# Altium integrated library ANLOGIC开发板封装库.IntLib: 55 symbols
Pins are listed as number, name and electrical type; pins without a type are passive.

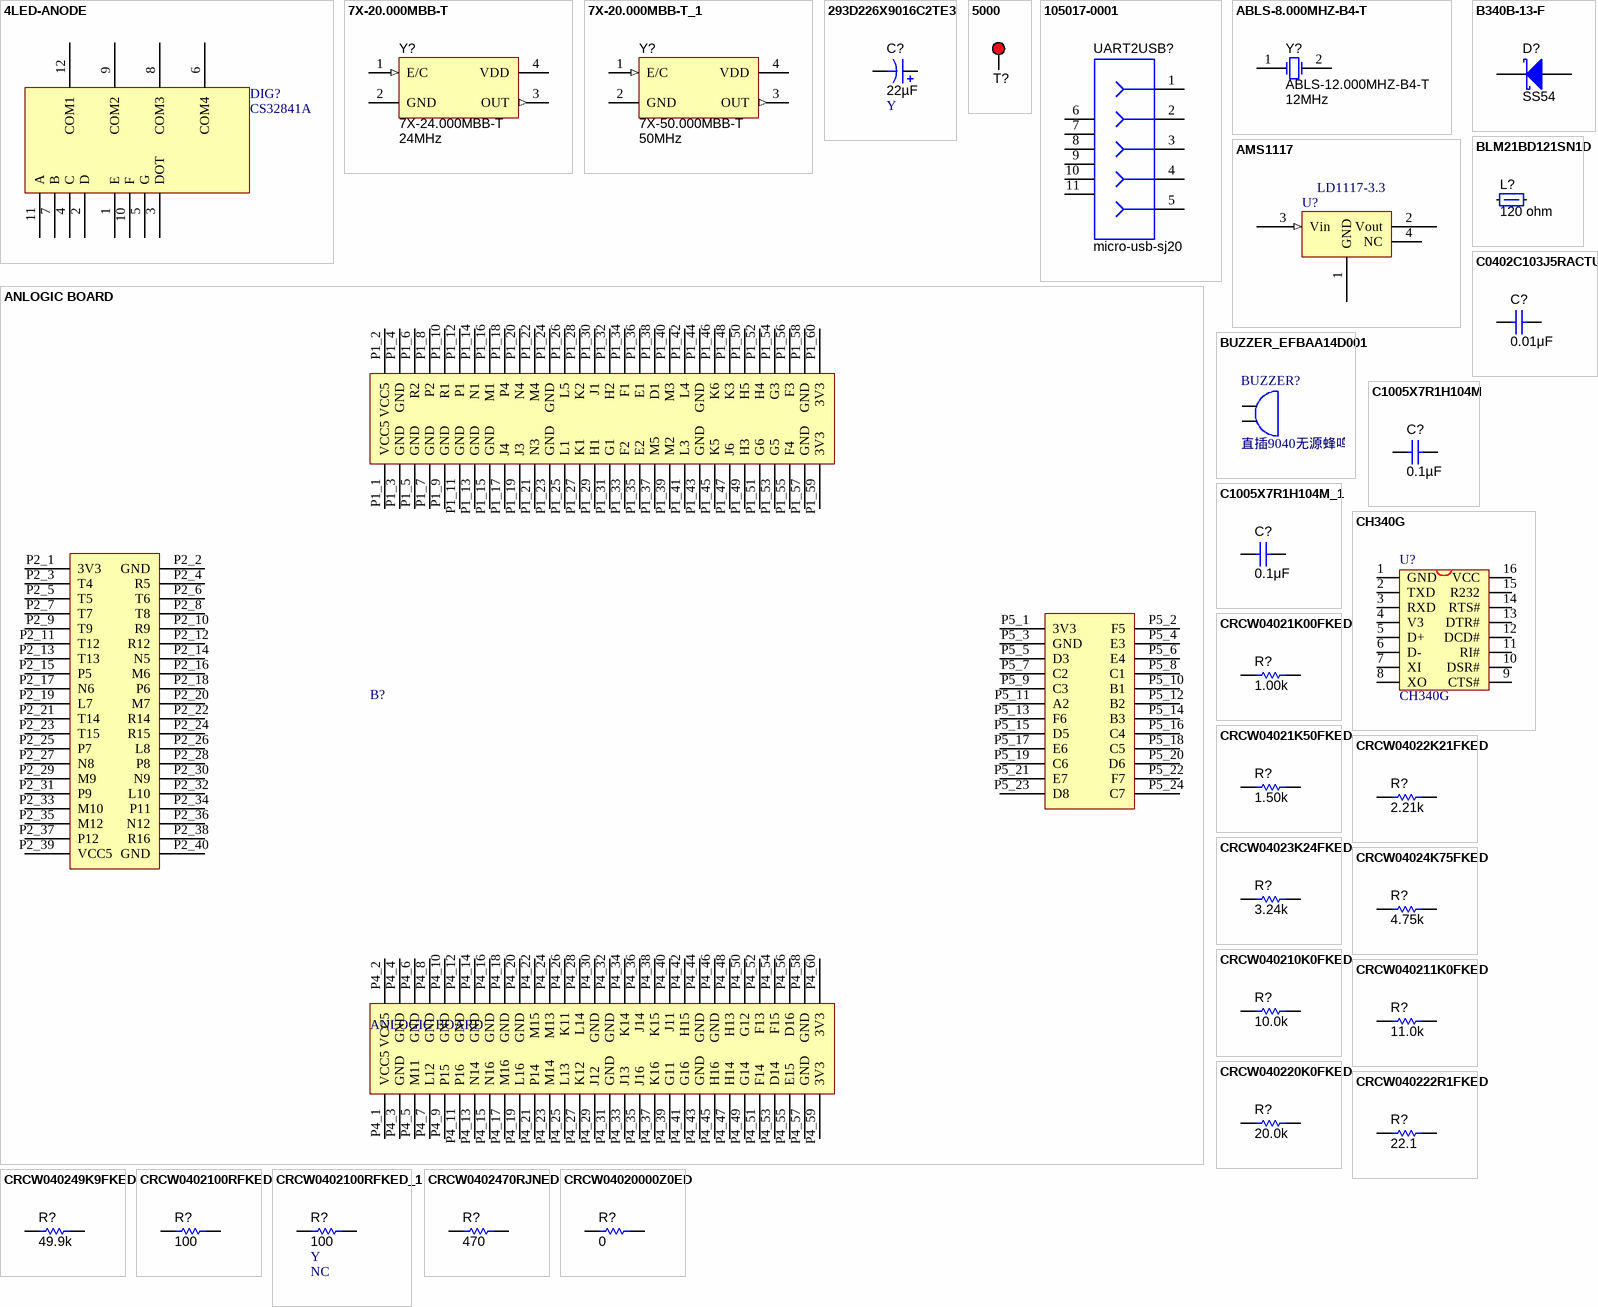
[diagram p0: symbols 4LED-ANODE to CRCW04020000Z0ED]

## 4LED-ANODE
designator DIG?, comment CS32841A
4位共阴数码管，红色
footprint DIP12-500
footprint CS2845AUR (4位数码管)
pins: 1 E, 2 D, 3 DOT, 4 C, 5 G, 6 COM4, 7 B, 8 COM3, 9 COM2, 10 F, 11 A, 12 COM1

## 7X-20.000MBB-T
designator Y?, comment 7X-24.000MBB-T  Frequency: 24MHz
Crystal, 有源晶振，Sealed Locked 24MHz, 15pF, SMD; Manufacturer: TXC Corporation; SymbolCreator: a0799628; CompType: Oscillator; U/M: EA; TaMin_C: -40; TaMax_C: 85; Frequency Stability: ?ppm; SymbolVersion: 2013-06-14; PartNumber: 7X-24.000MBB-T; PackageReference: 3.2x1x2.5 mm; MountType: SMT; RoHS: Y; ComponentLink1Description: Datasheet Link; ComponentLink1URL: http://www.txccrystal.com/images/pdf/7x.pdf; Publisher: Texas Instruments; LatestRevisionDate: 2013-06-18; LatestRevisionNote: Changed publisher; Supplier 1: Digi-Key; Supplier Part Number 1: 887-1217-1-ND; Supplier 2: Mouser; Supplier Part Number 2: 717-7X-20.000MBB-T; Supplier 3: Farnell; Supplier Part Number 3: 1842164
footprint XTAL_7050
footprint XTAL_NX3225SA (NDK NX3225SA recommended land pattern)
pins: 1 E/C (in), 2 GND (power), 3 OUT (out), 4 VDD (power)

## 7X-20.000MBB-T_1
designator Y?, comment 7X-50.000MBB-T  Frequency: 50MHz
Crystal, 有源晶振，Sealed Locked 50MHz, 15pF, SMD; Manufacturer: TXC Corporation; SymbolCreator: a0799628; CompType: Oscillator; U/M: EA; TaMin_C: -40; TaMax_C: 85; Frequency Stability: ?ppm; SymbolVersion: 2013-06-14; PartNumber: 7X-50.000MBB-T; PackageReference: 3.2x1x2.5 mm; MountType: SMT; RoHS: Y; ComponentLink1Description: Datasheet Link; ComponentLink1URL: http://www.txccrystal.com/images/pdf/7x.pdf; Publisher: Texas Instruments; LatestRevisionDate: 2013-06-18; LatestRevisionNote: Changed publisher; Supplier 1: Digi-Key; Supplier Part Number 1: 887-1217-1-ND; Supplier 2: Mouser; Supplier Part Number 2: 717-7X-20.000MBB-T; Supplier 3: Farnell; Supplier Part Number 3: 1842164
footprint XTAL_7050
footprint XTAL_NX3225SA (NDK NX3225SA recommended land pattern)
pins: 1 E/C (in), 2 GND (power), 3 OUT (out), 4 VDD (power)

## 293D226X9016C2TE3
designator C?, comment ValueDisplayed: 22µF  (hidden comment: Y)
CAP, TA, 22 µF, 16 V, +/- 10%, 1.8 ohm, SMD; PartNumber: 293D226X9016C2TE3; Manufacturer: Vishay-Sprague; CompType: Capacitor; Value: 22uF; U/M: EA; Cap_F: 0.000022; Tolerance_%: 10; Value1: 1.8 ohm; VDC_V: 16; Value2: 16V; ESR_ohm: 1.8; IRMS_A: 0.28; TaMin_C: -55; TaMax_C: 125; Cap_Case: C; Polarized: Y; SymbolVersion: 2008-07-09; PackageReference: 6032-28; RoHS: Y; MountType: SMT; Technology: TA; Series: 293D; Publisher: Texas Instruments; LatestRevisionDate: 2015-03-19; LatestRevisionNote: Updated supplier links; ComponentLink1Description: Datasheet link; ComponentLink1URL: http://www.vishay.com/docs/40002/293d.pdf; Supplier 1: Digi-Key; Supplier Part Number 1: 718-1066-1-ND; Supplier 2: Mouser; Supplier Part Number 2: 74-293D226X9016C2TE3; Supplier 3: Farnell; Supplier Part Number 3: 1754187; IGNORE: Y
signal-integrity model Cap
simulation model Cap
footprint 6032-28
pins: 1 +, 2 -

## 5000
designator T?  (value not drawn)
Test Point, TH, Miniature, Red; Manufacturer: Keystone; CompType: Test Point Loop; U/M: EA; SymbolVersion: 2008-04-04; PartNumber: 5000; Value: Red; RoHS: Y; PackageReference: Keystone5000; MountType: TH; ComponentLink1Description: Datasheet Link; ComponentLink1URL: http://www.keyelco.com/pdfs/M55p51.pdf; Publisher: Texas Instruments; LatestRevisionDate: 2012-12-26; LatestRevisionNote: Added parts, moved some to Hardware.IntLib; Supplier 1: Digi-Key; Supplier Part Number 1: 5000K-ND
footprint TP
pins: 1

## 105017-0001
designator UART2USB?, comment micro-usb-sj20
Receptacle, Micro-USB-B, Right Angle, SMD; Manufacturer: Molex; SymbolCreator: a0412235; CompType: Connector; U/M: EA; SymbolVersion: 2012-12-19; PartNumber: micro-usb-sj20; RoHS: Y; PackageReference: Micro USB receptacle; MountType: SMT; ComponentLink1Description: Datasheet Link; ComponentLink1URL: http://www.molex.com/pdm_docs/sd/1050170001_sd.pdf; Publisher: Texas Instruments; LatestRevisionDate: 2012-12-26; LatestRevisionNote: Added parts, moved some to Hardware.IntLib; Supplier 1: Digi-Key; Supplier Part Number 1: WM1399CT-ND; Supplier 2: Mouser; Supplier Part Number 2: 538-105017-0001; Supplier 3: Farnell; Supplier Part Number 3: 1847433
footprint YQMICRO-USB-SJ20 (MICRO-USB-SJ20)
pins: 1, 2, 3, 4, 5, 6, 7, 8, 9, 10, 11

## ABLS-8.000MHZ-B4-T
designator Y?, comment ABLS-12.000MHZ-B4-T  Frequency: 12MHz
Crystal, 12MHz, 18pF, SMD,无源; Manufacturer: Abracon Corportation; SymbolCreator: a0412235; U/M: EA; TaMin_C: 0; TaMax_C: 70; Frequency Stability: ±50ppm; SymbolVersion: 2008-07-09; PartNumber: ABLS-12.000MHZ-B4-T; CompType: Crystal; PackageReference: Crystal, 11.4x4.3x3.8mm; MountType: SMT; RoHS: Y; ComponentLink1Description: Datasheet Link; ComponentLink1URL: http://www.abracon.com/Resonators/abls.pdf; Publisher: Texas Instruments; LatestRevisionDate: 2015-05-05; Supplier 1: Digi-Key; Supplier Part Number 1: 535-10212-1-ND; Supplier 2: Mouser; Supplier Part Number 2: 815-ABLS-8.0M-T
footprint YQ_OSC5032
pins: 1 OSC1, 2 OSC2

## AMS1117
designator U?, comment LD1117-3.3
LDO电源
footprint SOT223-L
pins: 1 GND (power), 2 Vout (power), 3 Vin (in), 4 NC

## ANLOGIC BOARD
designator B?
LatestRevisionDate: 17-Jul-2002; LatestRevisionNote: Re-released for DXP Platform.; Publisher: Altium Limited
footprint ANLOGIC TOP BOARD
footprint ANLOGIC BOTTOM BOARD
pins: P1_1 VCC5, P1_2 VCC5, P1_3 GND, P1_4 GND, P1_5 GND, P1_6 R2, P1_7 GND, P1_8 P2, P1_9 GND, P1_10 R1, P1_11 GND, P1_12 P1, P1_13 GND, P1_14 N1, P1_15 GND, P1_16 M1, P1_17 J4, P1_18 P4, P1_19 J3, P1_20 N4, P1_21 N3, P1_22 M4, P1_23 GND, P1_24 GND, P1_25 L1, P1_26 L5, P1_27 K1, P1_28 K2, P1_29 H1, P1_30 J1, P1_31 G1, P1_32 H2, P1_33 F2, P1_34 F1, P1_35 E2, P1_36 E1, P1_37 M5, P1_38 D1, P1_39 M2, P1_40 M3, P1_41 L3, P1_42 L4, P1_43 GND, P1_44 GND, P1_45 K5, P1_46 K6, P1_47 J6, P1_48 K3, P1_49 H3, P1_50 H5, P1_51 G6, P1_52 H4, P1_53 G5, P1_54 G3, P1_55 F4, P1_56 F3, P1_57 GND, P1_58 GND, P1_59 3V3, P1_60 3V3, P2_1 3V3, P2_2 GND, P2_3 T4, P2_4 R5, P2_5 T5, P2_6 T6, P2_7 T7, P2_8 T8, P2_9 T9, P2_10 R9, P2_11 T12, P2_12 R12, P2_13 T13, P2_14 N5, P2_15 P5, P2_16 M6, P2_17 N6, P2_18 P6, P2_19 L7, P2_20 M7, P2_21 T14, P2_22 R14, P2_23 T15, P2_24 R15, P2_25 P7, P2_26 L8, P2_27 N8, P2_28 P8, P2_29 M9, P2_30 N9, P2_31 P9, P2_32 L10, P2_33 M10, P2_34 P11, P2_35 M12, P2_36 N12, P2_37 P12, P2_38 R16, P2_39 VCC5, P2_40 GND, P4_1 VCC5, P4_2 VCC5, P4_3 GND, P4_4 GND, P4_5 M11, P4_6 GND, P4_7 L12, P4_8 GND, P4_9 P15, P4_10 GND, P4_11 P16, P4_12 GND, P4_13 N14, P4_14 GND, P4_15 N16, P4_16 GND, P4_17 M16, P4_18 GND, P4_19 L16, P4_20 GND, P4_21 P14, P4_22 M15, P4_23 M14, P4_24 M13, P4_25 L13, P4_26 K11, P4_27 K12, P4_28 L14, P4_29 J12, P4_30 GND, P4_31 GND, P4_32 GND, P4_33 J13, P4_34 K14, P4_35 J16, P4_36 J14, P4_37 K16, P4_38 K15, P4_39 G11, P4_40 J11, P4_41 G16, P4_42 H15, P4_43 GND, P4_44 GND, P4_45 H16, P4_46 GND, P4_47 H14, P4_48 H13, P4_49 G14, P4_50 G12, P4_51 F14, P4_52 F13, P4_53 D14, P4_54 F15, P4_55 E15, P4_56 D16, P4_57 GND, P4_58 GND, P4_59 3V3, P4_60 3V3, P5_1 3V3, P5_2 F5, P5_3 GND, P5_4 E3, P5_5 D3, P5_6 E4, P5_7 C2, P5_8 C1, P5_9 C3, P5_10 B1, P5_11 A2, P5_12 B2, P5_13 F6, P5_14 B3, P5_15 D5, P5_16 C4, P5_17 E6, P5_18 C5, P5_19 C6, P5_20 D6, P5_21 E7, P5_22 F7, P5_23 D8, P5_24 C7

## B340B-13-F
designator D?, comment SS54
Diode, Schottky, 40 V, 3A, SMB; Manufacturer: Diodes Inc.; U/M: EA; Vf_V: 0.5; Value: 40V; Value2: 0.5V; Io_A: 3; Vr_V: 40; TJmax_C: 125; RJC_CperW: 25; CompType: Diode; SymbolVersion: 2008-12-08; PartNumber: SS54; PackageReference: SMB; Value1: 3A; MountType: SMT; Type: Schottky; RoHS: Y; Published: 2008-06-26; Publisher: Texas Instruments; LatestRevisionDate: 2015-04-30; ComponentLink1Description: Datasheet link; ComponentLink1URL: http://www.diodes.com/datasheets/ds30924.pdf; Supplier 1: Digi-Key; Supplier Part Number 1: B340B-FDICT-ND; Supplier 2: Mouser; Supplier Part Number 2: 621-B340B-F; Supplier 3: Farnell; Supplier Part Number 3: 1843677
signal-integrity model Diode
simulation model DI_B340B
footprint SMB
pins: 1 K, 2 A

## BLM21BD121SN1D
designator L?, comment value 120 ohm  (hidden comment: GZ2012V121TF)
Ferrite Bead, 120 ohm @ 100 MHz, 0.2 A, 0805; Manufacturer: MuRata; Imax_A: 0.2; DCR_ohm: 0.25; Value1: 0.25 ohm; Value2: 0.2A; ZTyp@100MHz_Ohm: 120; CompType: Ferrite Bead; SymbolVersion: 2009-06-02; PartNumber: GZ2012V121TF; MountType: SMT; PackageReference: 0805; Published: 2014-04-30; Publisher: Texas Instruments; LatestRevisionDate: 2015-05-01; ComponentLink1Description: Datasheet link; ComponentLink1URL: http://search.murata.co.jp/Ceramy/image/img/PDF/ENG/L0110S0100BLM21B.pdf; RoHS: Y; Supplier 1: Digi-Key; Supplier Part Number 1: 490-1044-1-ND; Supplier 2: Mouser; Supplier Part Number 2: 81-BLM21BD121SN1D; Supplier 3: Farnell; Supplier Part Number 3: 1515637
footprint 0805_HV
footprint 0805
footprint 0805M
footprint 0805L
pins: 1, 2

## BUZZER_EFBAA14D001
designator BUZZER?, comment 直插9040无源蜂鸣器
Buzzer, 74 dB min, 25V p-p, 8500pF @ 1kHz，直插9040无源蜂鸣器; Manufacturer: Panasonic; Area: 264,208; Value: {Value}; ComponentHeight: 0.276 inch; PackageReference: 0.550 DIA.; SymbolVersion: 07/31/2009 12:17:27; PartNumber: 直插9040无源蜂鸣器; ComponentLink1Description: AEO Datasheet Link
footprint BUZZER_9*9_4MM
pins: 1, 2

## C0402C103J5RACTU
designator C?  ValueDisplayed: 0.01μF  (hidden comment: C0402C103J5RACTU)
CAP, CERM, 0.01 μF, 50 V, +/- 5%, X7R, 0402; Manufacturer: Kemet; Polarized: N; CompType: Capacitor; Value: 0.01uF; U/M: EA; Cap_F: 0.00000001; Tolerance_%: 5; Value1: Unknown; VDC_V: 50; Value2: 50V; TaMin_C: -55; TaMax_C: 125; Cap_Case: 0402; SymbolVersion: 2008-07-09; PartNumber: C0402C103J5RACTU; PackageReference: 0402; RoHS: Y; MountType: SMT; Technology: Ceramic; TempCo: X7R; Published: 2008-06-19; Publisher: Texas Instruments; LatestRevisionDate: 2015-05-02; ComponentLink1Description: Datasheet link; ComponentLink1URL: http://www.kemet.com/Lists/ProductCatalog/Attachments/53/KEM_C1002_X7R_SMD.pdf; Supplier 1: Digi-Key; Supplier Part Number 1: 399-7758-1-ND; Supplier 2: Mouser; Supplier Part Number 2: 80-C0402C103J5R; Supplier 3: Farnell; Supplier Part Number 3: 2413922
signal-integrity model Cap
simulation model Cap
footprint 0402
footprint 0402M
footprint 0402L
footprint 0402S
pins: 1, 2

## C1005X7R1H104M
designator C?  ValueDisplayed: 0.1µF  (hidden comment: C1005X7R1H104M)
CAP, CERM, 0.1 µF, 50 V, +/- 20%, X7R, 0402; Manufacturer: TDK; Polarized: N; CompType: Capacitor; Value: 0.1uF; U/M: EA; Cap_F: 0.0000001; Tolerance_%: 20; Value1: Unknown; VDC_V: 50; Value2: 50V; TaMin_C: -55; TaMax_C: 125; Cap_Case: 0402; SymbolVersion: 2008-07-09; PartNumber: C1005X7R1H104M; PackageReference: 0402; RoHS: Y; MountType: SMT; Technology: Ceramic; TempCo: X7R; Published: 2008-06-19; Publisher: Texas Instruments; LatestRevisionDate: 2015-05-02; ComponentLink1Description: Datasheet link; Supplier 1: Digi-Key; Supplier Part Number 1: 445-5933-1-ND; Supplier 2: Farnell; Supplier Part Number 2: 1907278
signal-integrity model Cap
simulation model Cap
footprint 0402
footprint 0402M
footprint 0402L
footprint 0402S
pins: 1, 2

## C1005X7R1H104M_1
designator C?, comment ValueDisplayed: 0.1μF  (hidden comment: C1005X7R1H104M)
CAP, CERM, 0.1 μF, 50 V, +/- 20%, X7R, 0402; Manufacturer: TDK; Polarized: N; CompType: Capacitor; Value: 0.1uF; U/M: EA; Cap_F: 0.0000001; Tolerance_%: 20; Value1: Unknown; VDC_V: 50; Value2: 50V; TaMin_C: -55; TaMax_C: 125; Cap_Case: 0402; SymbolVersion: 2008-07-09; PartNumber: C1005X7R1H104M; PackageReference: 0402; RoHS: Y; MountType: SMT; Technology: Ceramic; TempCo: X7R; Published: 2008-06-19; Publisher: Texas Instruments; LatestRevisionDate: 2015-05-02; ComponentLink1Description: Datasheet link; Supplier 1: Digi-Key; Supplier Part Number 1: 445-5933-1-ND; Supplier 2: Farnell; Supplier Part Number 2: 1907278
signal-integrity model Cap
simulation model Cap
footprint 0402
footprint 0402M
footprint 0402L
footprint 0402S
pins: 1, 2

## CH340G
designator U?
USB2UART
footprint SOP16M (Small Outline; 16 Leads; Body Width 3.9 mm; Pitch 1.27 mm)
pins: 1 GND, 2 TXD, 3 RXD, 4 V3, 5 D+, 6 D-, 7 XI, 8 XO, 9 CTS#, 10 DSR#, 11 RI#, 12 DCD#, 13 DTR#, 14 RTS#, 15 R232, 16 VCC

## CRCW04021K00FKED
designator R?  ValueDisplayed: 1.00k  (hidden comment: CRCW04021K00FKED)
RES, 1.00 k, 1%, 0.063 W, 0402; Manufacturer: Vishay-Dale; CompType: Resistor; Value: 1.00k; Res_ohm: 1000; Value_Code: 1k00; Tolerance_%: 1; Power_W: 0.063; Value2: 0.063W; VDC_V: 50; TempCo: 100 ppm/C; EIA_Code: E96; U/M: EA; SymbolVersion: 2009-05-29; PartNumber: CRCW04021K00FKED; PackageReference: 0402; RoHS: Y; Value1: 1%; MountType: SMT; Technology: Thick Film; Published: 2008-06-26; Publisher: Texas Instruments; LatestRevisionDate: 2015-05-01; ComponentLink1Description: Datasheet link; ComponentLink1URL: http://www.vishay.com/docs/20035/dcrcwe3.pdf; Supplier 1: Digi-Key; Supplier Part Number 1: 541-1.00KLCT-ND; Supplier 2: Mouser; Supplier Part Number 2: 71-CRCW0402-1.0K-E3; Supplier 3: Farnell; Supplier Part Number 3: 1469662
signal-integrity model Resistor
simulation model Resistor
footprint 0402
footprint 0402M
footprint 0402L
footprint 0402S
pins: 1, 2

## CRCW04021K50FKED
designator R?  ValueDisplayed: 1.50k  (hidden comment: CRCW04021K50FKED)
RES, 1.50 k, 1%, 0.063 W, 0402; Manufacturer: Vishay-Dale; CompType: Resistor; Value: 1.50k; Res_ohm: 1500; Value_Code: 1k50; Tolerance_%: 1; Power_W: 0.063; Value2: 0.063W; VDC_V: 50; TempCo: 100 ppm/C; EIA_Code: E96; U/M: EA; SymbolVersion: 2009-05-29; PartNumber: CRCW04021K50FKED; PackageReference: 0402; RoHS: Y; Value1: 1%; MountType: SMT; Technology: Thick Film; Published: 2008-06-26; Publisher: Texas Instruments; LatestRevisionDate: 2015-05-01; ComponentLink1Description: Datasheet link; ComponentLink1URL: http://www.vishay.com/docs/20035/dcrcwe3.pdf; Supplier 1: Digi-Key; Supplier Part Number 1: 541-1.50KLCT-ND; Supplier 2: Mouser; Supplier Part Number 2: 71-CRCW0402-1.5K-E3; Supplier 3: Farnell; Supplier Part Number 3: 1653201
signal-integrity model Resistor
simulation model Resistor
footprint 0402
footprint 0402M
footprint 0402L
footprint 0402S
pins: 1, 2

## CRCW04022K21FKED
designator R?  ValueDisplayed: 2.21k  (hidden comment: CRCW04022K21FKED)
RES, 2.21 k, 1%, 0.063 W, 0402; Manufacturer: Vishay-Dale; CompType: Resistor; Value: 2.21k; Res_ohm: 2210; Value_Code: 2k21; Tolerance_%: 1; Power_W: 0.063; Value2: 0.063W; VDC_V: 50; TempCo: 100 ppm/C; EIA_Code: E96; U/M: EA; SymbolVersion: 2009-05-29; PartNumber: CRCW04022K21FKED; PackageReference: 0402; RoHS: Y; Value1: 1%; MountType: SMT; Technology: Thick Film; Published: 2008-06-26; Publisher: Texas Instruments; LatestRevisionDate: 2015-05-01; ComponentLink1Description: Datasheet link; ComponentLink1URL: http://www.vishay.com/docs/20035/dcrcwe3.pdf; Supplier 1: Digi-Key; Supplier Part Number 1: 541-2.21KLCT-ND; Supplier 2: Mouser; Supplier Part Number 2: 71-CRCW0402-2.21K-E3; Supplier 3: Farnell; Supplier Part Number 3: 1469689
signal-integrity model Resistor
simulation model Resistor
footprint 0402
footprint 0402M
footprint 0402L
footprint 0402S
pins: 1, 2

## CRCW04023K24FKED
designator R?  ValueDisplayed: 3.24k  (hidden comment: CRCW04023K24FKED)
RES, 3.24 k, 1%, 0.063 W, 0402; Manufacturer: Vishay-Dale; CompType: Resistor; Value: 3.24k; Res_ohm: 3240; Value_Code: 3k24; Tolerance_%: 1; Power_W: 0.063; Value2: 0.063W; VDC_V: 50; TempCo: 100 ppm/C; EIA_Code: E96; U/M: EA; SymbolVersion: 2009-05-29; PartNumber: CRCW04023K24FKED; PackageReference: 0402; RoHS: Y; Value1: 1%; MountType: SMT; Technology: Thick Film; Published: 2008-06-26; Publisher: Texas Instruments; LatestRevisionDate: 2015-05-01; ComponentLink1Description: Datasheet link; ComponentLink1URL: http://www.vishay.com/docs/20035/dcrcwe3.pdf; Supplier 1: Digi-Key; Supplier Part Number 1: 541-3.24KLCT-ND; Supplier 2: Mouser; Supplier Part Number 2: 71-CRCW0402-3.24K-E3; Supplier 3: Farnell; Supplier Part Number 3: 1151130
signal-integrity model Resistor
simulation model Resistor
footprint 0402
footprint 0402M
footprint 0402L
footprint 0402S
pins: 1, 2

## CRCW04024K75FKED
designator R?  ValueDisplayed: 4.75k  (hidden comment: CRCW04024K75FKED)
RES, 4.75 k, 1%, 0.063 W, 0402; Manufacturer: Vishay-Dale; CompType: Resistor; Value: 4.75k; Res_ohm: 4750; Value_Code: 4k75; Tolerance_%: 1; Power_W: 0.063; Value2: 0.063W; VDC_V: 50; TempCo: 100 ppm/C; EIA_Code: E96; U/M: EA; SymbolVersion: 2009-05-29; PartNumber: CRCW04024K75FKED; PackageReference: 0402; RoHS: Y; Value1: 1%; MountType: SMT; Technology: Thick Film; Published: 2008-06-26; Publisher: Texas Instruments; LatestRevisionDate: 2015-05-01; ComponentLink1Description: Datasheet link; ComponentLink1URL: http://www.vishay.com/docs/20035/dcrcwe3.pdf; Supplier 1: Digi-Key; Supplier Part Number 1: 541-4.75KLCT-ND; Supplier 2: Mouser; Supplier Part Number 2: 71-CRCW0402-4.75K-E3; Supplier 3: Farnell; Supplier Part Number 3: 1469713
signal-integrity model Resistor
simulation model Resistor
footprint 0402
footprint 0402M
footprint 0402L
footprint 0402S
pins: 1, 2

## CRCW040210K0FKED
designator R?  ValueDisplayed: 10.0k  (hidden comment: CRCW040210K0FKED)
RES, 10.0 k, 1%, 0.063 W, 0402; Manufacturer: Vishay-Dale; CompType: Resistor; Value: 10.0k; Res_ohm: 10000; Value_Code: 10k0; Tolerance_%: 1; Power_W: 0.063; Value2: 0.063W; VDC_V: 50; TempCo: 100 ppm/C; EIA_Code: E96; U/M: EA; SymbolVersion: 2009-05-29; PartNumber: CRCW040210K0FKED; PackageReference: 0402; RoHS: Y; Value1: 1%; MountType: SMT; Technology: Thick Film; Published: 2008-06-26; Publisher: Texas Instruments; LatestRevisionDate: 2015-05-01; ComponentLink1Description: Datasheet link; ComponentLink1URL: http://www.vishay.com/docs/20035/dcrcwe3.pdf; Supplier 1: Digi-Key; Supplier Part Number 1: 541-10.0KLCT-ND; Supplier 2: Mouser; Supplier Part Number 2: 71-CRCW0402-10K-E3; Supplier 3: Farnell; Supplier Part Number 3: 1469669
signal-integrity model Resistor
simulation model Resistor
footprint 0402
footprint 0402M
footprint 0402L
footprint 0402S
pins: 1, 2

## CRCW040211K0FKED
designator R?  ValueDisplayed: 11.0k  (hidden comment: CRCW040211K0FKED)
RES, 11.0 k, 1%, 0.063 W, 0402; Manufacturer: Vishay-Dale; CompType: Resistor; Value: 11.0k; Res_ohm: 11000; Value_Code: 11k0; Tolerance_%: 1; Power_W: 0.063; Value2: 0.063W; VDC_V: 50; TempCo: 100 ppm/C; EIA_Code: E96; U/M: EA; SymbolVersion: 2009-05-29; PartNumber: CRCW040211K0FKED; PackageReference: 0402; RoHS: Y; Value1: 1%; MountType: SMT; Technology: Thick Film; Published: 2008-06-26; Publisher: Texas Instruments; LatestRevisionDate: 2015-05-01; ComponentLink1Description: Datasheet link; ComponentLink1URL: http://www.vishay.com/docs/20035/dcrcwe3.pdf; Supplier 1: Digi-Key; Supplier Part Number 1: 541-11.0KLCT-ND; Supplier 2: Mouser; Supplier Part Number 2: 71-CRCW0402-11K-E3; Supplier 3: Farnell; Supplier Part Number 3: 1469673
signal-integrity model Resistor
simulation model Resistor
footprint 0402
footprint 0402M
footprint 0402L
footprint 0402S
pins: 1, 2

## CRCW040220K0FKED
designator R?  ValueDisplayed: 20.0k  (hidden comment: CRCW040220K0FKED)
RES, 20.0 k, 1%, 0.063 W, 0402; Manufacturer: Vishay-Dale; CompType: Resistor; Value: 20.0k; Res_ohm: 20000; Value_Code: 20k0; Tolerance_%: 1; Power_W: 0.063; Value2: 0.063W; VDC_V: 50; TempCo: 100 ppm/C; EIA_Code: E96; U/M: EA; SymbolVersion: 2009-05-29; PartNumber: CRCW040220K0FKED; PackageReference: 0402; RoHS: Y; Value1: 1%; MountType: SMT; Technology: Thick Film; Published: 2008-06-26; Publisher: Texas Instruments; LatestRevisionDate: 2015-05-01; ComponentLink1Description: Datasheet link; ComponentLink1URL: http://www.vishay.com/docs/20035/dcrcwe3.pdf; Supplier 1: Digi-Key; Supplier Part Number 1: 541-20.0KLCT-ND; Supplier 2: Mouser; Supplier Part Number 2: 71-CRCW0402-20K-E3; Supplier 3: Farnell; Supplier Part Number 3: 1469693
signal-integrity model Resistor
simulation model Resistor
footprint 0402
footprint 0402M
footprint 0402L
footprint 0402S
pins: 1, 2

## CRCW040222R1FKED
designator R?  ValueDisplayed: 22.1  (hidden comment: CRCW040222R1FKED)
RES, 22.1, 1%, 0.063 W, 0402; Manufacturer: Vishay-Dale; CompType: Resistor; Value: 22.1; Value_Code: 22R1; Tolerance_%: 1; Power_W: 0.063; Value2: 0.063W; VDC_V: 50; TempCo: 100 ppm/C; EIA_Code: E96; U/M: EA; SymbolVersion: 2009-05-29; PartNumber: CRCW040222R1FKED; PackageReference: 0402; RoHS: Y; Res_ohm: 22.1; Value1: 1%; MountType: SMT; Technology: Thick Film; Published: 2008-06-26; Publisher: Texas Instruments; LatestRevisionDate: 2015-05-01; ComponentLink1Description: Datasheet link; ComponentLink1URL: http://www.vishay.com/docs/20035/dcrcwe3.pdf; Supplier 1: Digi-Key; Supplier Part Number 1: 541-22.1LCT-ND; Supplier 2: Mouser; Supplier Part Number 2: 71-CRCW0402-22.1-E3; Supplier 3: Farnell; Supplier Part Number 3: 1469698
signal-integrity model Resistor
simulation model Resistor
footprint 0402
footprint 0402M
footprint 0402L
footprint 0402S
pins: 1, 2

## CRCW040249K9FKED
designator R?  ValueDisplayed: 49.9k  (hidden comment: CRCW040249K9FKED)
RES, 49.9 k, 1%, 0.063 W, 0402; Manufacturer: Vishay-Dale; CompType: Resistor; Value: 49.9k; Res_ohm: 49900; Value_Code: 49k9; Tolerance_%: 1; Power_W: 0.063; Value2: 0.063W; VDC_V: 50; TempCo: 100 ppm/C; EIA_Code: E96; U/M: EA; SymbolVersion: 2009-05-29; PartNumber: CRCW040249K9FKED; PackageReference: 0402; RoHS: Y; Value1: 1%; MountType: SMT; Technology: Thick Film; Published: 2008-06-26; Publisher: Texas Instruments; LatestRevisionDate: 2015-05-01; ComponentLink1Description: Datasheet link; ComponentLink1URL: http://www.vishay.com/docs/20035/dcrcwe3.pdf; Supplier 1: Digi-Key; Supplier Part Number 1: 541-49.9KLCT-ND; Supplier 2: Mouser; Supplier Part Number 2: 71-CRCW0402-49.9K-E3; Supplier 3: Farnell; Supplier Part Number 3: 1469720
signal-integrity model Resistor
simulation model Resistor
footprint 0402
footprint 0402M
footprint 0402L
footprint 0402S
pins: 1, 2

## CRCW0402100RFKED
designator R?  ValueDisplayed: 100  (hidden comment: CRCW0402100RFKED)
RES, 100, 1%, 0.063 W, 0402; Manufacturer: Vishay-Dale; CompType: Resistor; Value: 100; Value_Code: 100R; Tolerance_%: 1; Power_W: 0.063; Value2: 0.063W; VDC_V: 50; TempCo: 100 ppm/C; EIA_Code: E96; U/M: EA; SymbolVersion: 2009-05-29; PartNumber: CRCW0402100RFKED; PackageReference: 0402; RoHS: Y; Res_ohm: 100; Value1: 1%; MountType: SMT; Technology: Thick Film; Published: 2008-06-26; Publisher: Texas Instruments; LatestRevisionDate: 2015-05-01; ComponentLink1Description: Datasheet link; ComponentLink1URL: http://www.vishay.com/docs/20035/dcrcwe3.pdf; Supplier 1: Digi-Key; Supplier Part Number 1: 541-100LCT-ND; Supplier 2: Mouser; Supplier Part Number 2: 71-CRCW0402-100-E3; Supplier 3: Farnell; Supplier Part Number 3: 1469672
signal-integrity model Resistor
simulation model Resistor
footprint 0402 (0402 from SM-752 data)
footprint 0402M
footprint 0402L
footprint 0402S
pins: 1, 2

## CRCW0402100RFKED_1
designator R?, comment ValueDisplayed: 100  Parameter 1: NC  (hidden comment: Y)
RES, 100, 1%, 0.063 W, 0402; PartNumber: CRCW0402100RFKED; Manufacturer: Vishay-Dale; CompType: Resistor; Value: 100; Value_Code: 100R; Tolerance_%: 1; Power_W: 0.063; Value2: 0.063W; VDC_V: 50; TempCo: 100 ppm/C; EIA_Code: E96; U/M: EA; SymbolVersion: 2009-05-29; PackageReference: 0402; RoHS: Y; Res_ohm: 100; Value1: 1%; MountType: SMT; Technology: Thick Film; Published: 2008-06-26; Publisher: Texas Instruments; LatestRevisionDate: 2015-05-01; ComponentLink1Description: Datasheet link; ComponentLink1URL: http://www.vishay.com/docs/20035/dcrcwe3.pdf; Supplier 1: Digi-Key; Supplier Part Number 1: 541-100LCT-ND; Supplier 2: Mouser; Supplier Part Number 2: 71-CRCW0402-100-E3; Supplier 3: Farnell; Supplier Part Number 3: 1469672; IGNORE: Y
signal-integrity model Resistor
simulation model Resistor
footprint 0402 (0402 from SM-752 data)
footprint 0402M
footprint 0402L
footprint 0402S
pins: 1, 2
